# Altium footprint library ST Microelectronics STM32 G4.PcbLib: 21 footprints (part 2 of 3)
Each footprint in its own frame and in the unit in brackets; x right, y up, seen from the top. Pads: shape width x height; smd on the part's side, far side on the other; paste and mask are expansions set on the pad; w line width, h text height; cw(c..) or ccw(c..) is an arc to the next point about the centre after c.
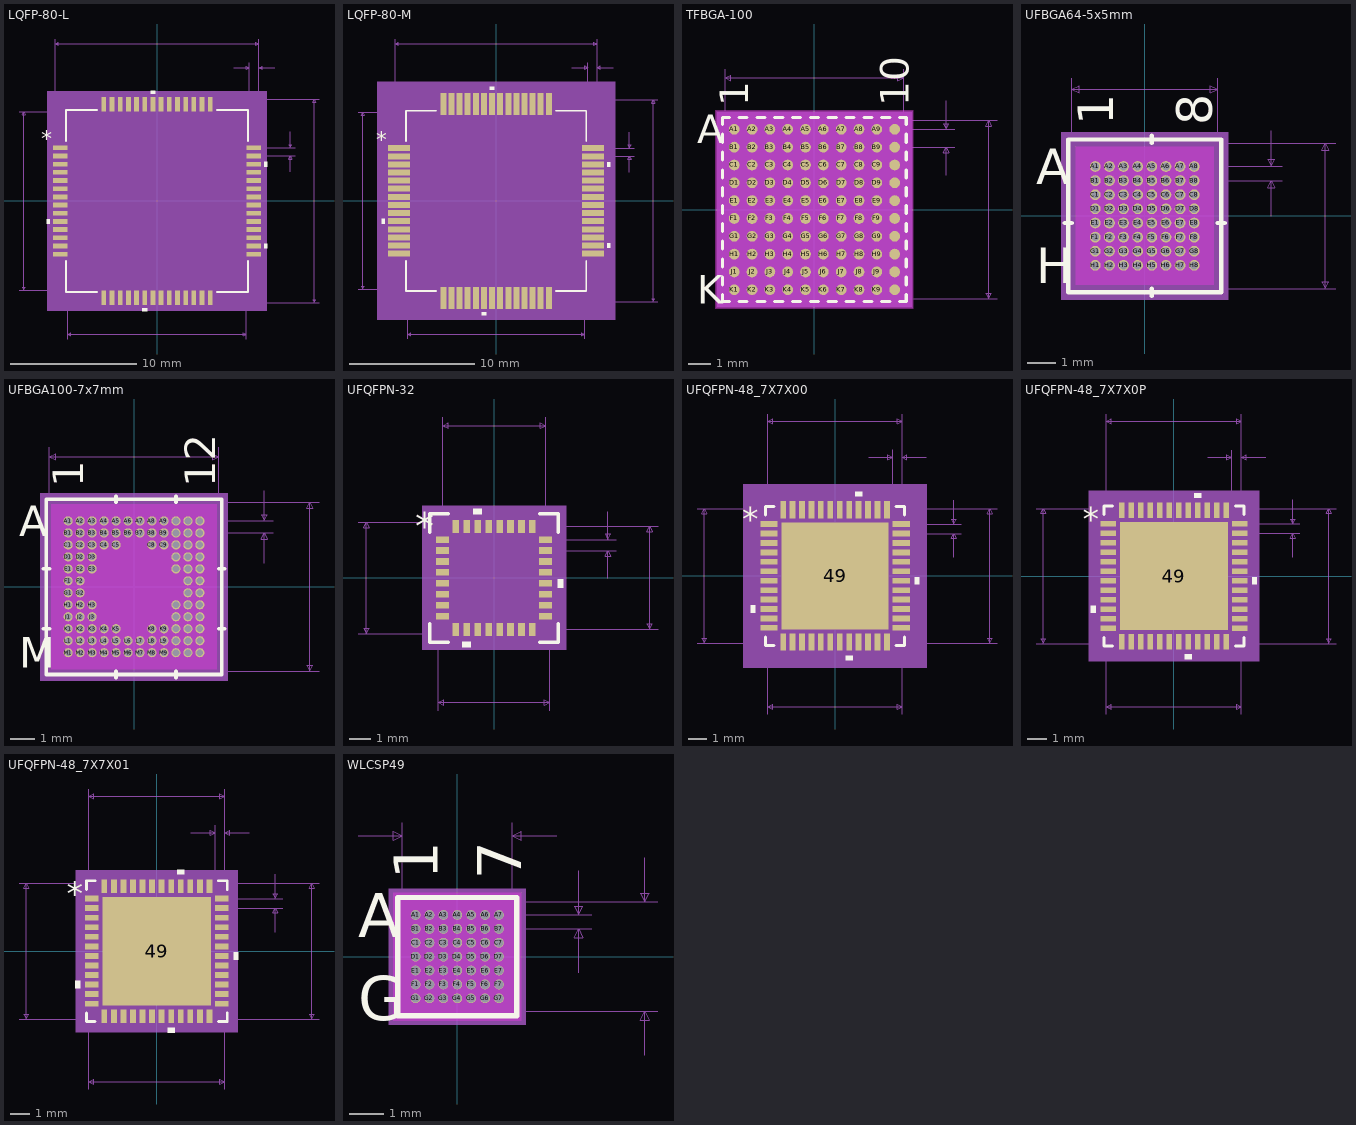
[diagram p1: the footprints below, top view; thin cyan lines are the x and y axes]

## LQFP-80-L [mil]
pads (56):
  rect 45.5x15 smd paste+0 mask+0: 1(-302.15,166.4) 2(-302.15,140.8) 3(-302.15,115.2) 4(-302.15,89.6) 5(-302.15,64) 6(-302.15,38.4) 7(-302.15,12.8) 8(-302.15,-12.8) 9(-302.15,-38.4) 10(-302.15,-64) 11(-302.15,-89.6) 12(-302.15,-115.2) 13(-302.15,-140.8) 14(-302.15,-166.4) 29(302.15,-166.4) 30(302.15,-140.8) 31(302.15,-115.2) 32(302.15,-89.6) 33(302.15,-64) 34(302.15,-38.4) 35(302.15,-12.8) 36(302.15,12.8) 37(302.15,38.4) 38(302.15,64) 39(302.15,89.6) 40(302.15,115.2) 41(302.15,140.8) 42(302.15,166.4)
  rect 15x45.5 smd paste+0 mask+0: 15(-166.4,-302.15) 16(-140.8,-302.15) 17(-115.2,-302.15) 18(-89.6,-302.15) 19(-64,-302.15) 20(-38.4,-302.15) 21(-12.8,-302.15) 22(12.8,-302.15) 23(38.4,-302.15) 24(64,-302.15) 25(89.6,-302.15) 26(115.2,-302.15) 27(140.8,-302.15) 28(166.4,-302.15) 43(166.4,302.15) 44(140.8,302.15) 45(115.2,302.15) 46(89.6,302.15) 47(64,302.15) 48(38.4,302.15) 49(12.8,302.15) 50(-12.8,302.15) 51(-38.4,302.15) 52(-64,302.15) 53(-89.6,302.15) 54(-115.2,302.15) 55(-140.8,302.15) 56(-166.4,302.15)
Top Overlay:
  region: -5.3,334.9 -20.3,334.9 -20.3,344.9 -5.3,344.9
  region: 334.9,122.7 344.9,122.7 344.9,107.7 334.9,107.7
  region: 334.9,-133.3 344.9,-133.3 344.9,-148.3 334.9,-148.3
  region: -30.9,-334.9 -45.9,-334.9 -45.9,-344.9 -30.9,-344.9
  region: -334.9,-56.5 -344.9,-56.5 -344.9,-71.5 -334.9,-71.5
  lines w6: -284.55,-187 -284.55,-284.55 -187,-284.55 ; -284.55,187 -284.55,284.55 -187,284.55 ; 187,-284.55 284.55,-284.55 284.55,-187 ; 187,284.55 284.55,284.55 284.55,187
  text "*" at -362.4,169.2 h50
Mechanical 5:
  region: 343.9,-343.9 -343.9,-343.9 -343.9,343.9 343.9,343.9
Mechanical 7:
  lines w1: -431.9,-279.55 -166.4,-279.55 ; -431.9,279.55 -166.4,279.55 ; -318.9,166.4 -318.9,506.9 ; -279.55,-431.9 -279.55,-166.4 ; 166.4,-318.9 506.9,-318.9 ; 166.4,318.9 506.9,318.9 ; 239.4,416.9 289.4,416.9 ; 279.55,-431.9 279.55,-166.4 ; 289.4,166.4 289.4,431.9 ; 302.15,140.8 431.9,140.8 ; 302.15,166.4 431.9,166.4 ; 318.9,431.9 318.9,166.4 318.9,506.9 ; 368.9,416.9 318.9,416.9 ; 416.9,90.8 416.9,140.8 ; 416.9,216.4 416.9,166.4 ; -416.9,-279.55 -411.9,-269.55 -421.9,-269.55 -416.9,-279.55 ; -416.9,-279.55 -416.9,279.55 ; -416.9,279.55 -411.9,269.55 -421.9,269.55 -416.9,279.55 ; -318.9,491.9 -308.9,486.9 -308.9,496.9 -318.9,491.9 ; -318.9,491.9 318.9,491.9 ; -279.55,-416.9 -269.55,-421.9 -269.55,-411.9 -279.55,-416.9 ; -279.55,-416.9 279.55,-416.9 ; 279.55,-416.9 269.55,-421.9 269.55,-411.9 279.55,-416.9 ; 289.4,416.9 279.4,411.9 279.4,421.9 289.4,416.9 ; 318.9,416.9 328.9,411.9 328.9,421.9 318.9,416.9 ; 318.9,491.9 308.9,486.9 308.9,496.9 318.9,491.9 ; 416.9,140.8 421.9,130.8 411.9,130.8 416.9,140.8 ; 416.9,166.4 421.9,176.4 411.9,176.4 416.9,166.4 ; 491.9,-318.9 496.9,-308.9 486.9,-308.9 491.9,-318.9 ; 491.9,-318.9 491.9,318.9 ; 491.9,318.9 496.9,308.9 486.9,308.9 491.9,318.9
  text "0.638in/16.2mm" at 511.9,-12.5 h25
  text "0.559in/14.201mm" at -636.9,-12.5 h25
  text "0.559in/14.201mm" at -100,-461.9 h25
  text "0.638in/16.2mm" at -87.5,511.9 h25
  text "0.03in/0.749mm" at 216.65,436.9 h25
  text "0.026in/0.65mm" at 436.9,141.1 h25
  text "Alt 2 Padstyle: OX90Y60D30P" at -337.5,-866.9 h50
  text "Alt 1 Padstyle: OX60Y90D30P" at -337.5,-806.9 h50
  text "Default Vert Padstyle: RX15Y45p5D0T" at -437.5,-626.9 h50
  text "Default Horiz Padstyle: RX15Y45p5D0T" at -450,-566.9 h50
Mechanical 13:
  drawing of 229 lines, arcs and shapes, not listed
  text "*" at -277.05,154.2 h50
Mechanical 15:
  region: -177.9,-283.55 -283.55,-283.55 -283.55,-177.9 -328.9,-177.9 -328.9,177.9 -283.55,177.9 -283.55,283.55 -177.9,283.55 -177.9,328.9 177.9,328.9 177.9,283.55 283.55,283.55 283.55,177.9 328.9,177.9 328.9,-177.9 283.55,-177.9 283.55,-283.55 177.9,-283.55 177.9,-328.9 -177.9,-328.9
  lines w6: -328.9,-177.9 -328.9,177.9 -283.55,177.9 -283.55,283.55 -177.9,283.55 -177.9,328.9 177.9,328.9 177.9,283.55 283.55,283.55 283.55,177.9 328.9,177.9 328.9,-177.9 283.55,-177.9 283.55,-283.55 177.9,-283.55 177.9,-328.9 -177.9,-328.9 -177.9,-283.55 -283.55,-283.55 -283.55,-177.9 -328.9,-177.9
3D body "LQFP-80-L.step": height 63.11, standoff 0, extent -318.89,-318.89 318.9,318.9

## LQFP-80-M [mil]
pads (56):
  rect 69.5x19 smd paste+0 mask+0: 1(-306.15,166.4) 2(-306.15,140.8) 3(-306.15,115.2) 4(-306.15,89.6) 5(-306.15,64) 6(-306.15,38.4) 7(-306.15,12.8) 8(-306.15,-12.8) 9(-306.15,-38.4) 10(-306.15,-64) 11(-306.15,-89.6) 12(-306.15,-115.2) 13(-306.15,-140.8) 14(-306.15,-166.4) 29(306.15,-166.4) 30(306.15,-140.8) 31(306.15,-115.2) 32(306.15,-89.6) 33(306.15,-64) 34(306.15,-38.4) 35(306.15,-12.8) 36(306.15,12.8) 37(306.15,38.4) 38(306.15,64) 39(306.15,89.6) 40(306.15,115.2) 41(306.15,140.8) 42(306.15,166.4)
  rect 19x69.5 smd paste+0 mask+0: 15(-166.4,-306.15) 16(-140.8,-306.15) 17(-115.2,-306.15) 18(-89.6,-306.15) 19(-64,-306.15) 20(-38.4,-306.15) 21(-12.8,-306.15) 22(12.8,-306.15) 23(38.4,-306.15) 24(64,-306.15) 25(89.6,-306.15) 26(115.2,-306.15) 27(140.8,-306.15) 28(166.4,-306.15) 43(166.4,306.15) 44(140.8,306.15) 45(115.2,306.15) 46(89.6,306.15) 47(64,306.15) 48(38.4,306.15) 49(12.8,306.15) 50(-12.8,306.15) 51(-38.4,306.15) 52(-64,306.15) 53(-89.6,306.15) 54(-115.2,306.15) 55(-140.8,306.15) 56(-166.4,306.15)
Top Overlay:
  region: -350.9,-56.5 -360.9,-56.5 -360.9,-71.5 -350.9,-71.5
  region: -30.9,-350.9 -45.9,-350.9 -45.9,-360.9 -30.9,-360.9
  region: 350.9,-133.3 360.9,-133.3 360.9,-148.3 350.9,-148.3
  region: 350.9,122.7 360.9,122.7 360.9,107.7 350.9,107.7
  region: -5.3,350.9 -20.3,350.9 -20.3,360.9 -5.3,360.9
  lines w6: -284.55,-189 -284.55,-284.55 -189,-284.55 ; -284.55,189 -284.55,284.55 -189,284.55 ; 189,-284.55 284.55,-284.55 284.55,-189 ; 189,284.55 284.55,284.55 284.55,189
  text "*" at -378.4,169.2 h50
Mechanical 5:
  region: 375.9,-375.9 -375.9,-375.9 -375.9,375.9 375.9,375.9
Mechanical 7:
  lines w1: -435.9,-279.55 -166.4,-279.55 ; -435.9,279.55 -166.4,279.55 ; -318.9,166.4 -318.9,510.9 ; -279.55,-435.9 -279.55,-166.4 ; 166.4,-318.9 510.9,-318.9 ; 166.4,318.9 510.9,318.9 ; 239.4,420.9 289.4,420.9 ; 279.55,-435.9 279.55,-166.4 ; 289.4,166.4 289.4,435.9 ; 306.15,140.8 435.9,140.8 ; 306.15,166.4 435.9,166.4 ; 318.9,435.9 318.9,166.4 318.9,510.9 ; 368.9,420.9 318.9,420.9 ; 420.9,90.8 420.9,140.8 ; 420.9,216.4 420.9,166.4 ; -420.9,-279.55 -420.9,279.55 ; -420.9,-279.55 -425.9,-269.55 -415.9,-269.55 -420.9,-279.55 ; -420.9,279.55 -425.9,269.55 -415.9,269.55 -420.9,279.55 ; -318.9,495.9 318.9,495.9 ; -318.9,495.9 -308.9,500.9 -308.9,490.9 -318.9,495.9 ; -279.55,-420.9 279.55,-420.9 ; -279.55,-420.9 -269.55,-415.9 -269.55,-425.9 -279.55,-420.9 ; 279.55,-420.9 269.55,-415.9 269.55,-425.9 279.55,-420.9 ; 289.4,420.9 279.4,425.9 279.4,415.9 289.4,420.9 ; 318.9,420.9 328.9,425.9 328.9,415.9 318.9,420.9 ; 318.9,495.9 308.9,500.9 308.9,490.9 318.9,495.9 ; 420.9,140.8 415.9,130.8 425.9,130.8 420.9,140.8 ; 420.9,166.4 415.9,176.4 425.9,176.4 420.9,166.4 ; 495.9,-318.9 495.9,318.9 ; 495.9,-318.9 490.9,-308.9 500.9,-308.9 495.9,-318.9 ; 495.9,318.9 490.9,308.9 500.9,308.9 495.9,318.9
  text "Default Horiz Padstyle: RX19Y69p5D0T" at -450,-570.9 h50
  text "Default Vert Padstyle: RX19Y69p5D0T" at -437.5,-630.9 h50
  text "Alt 1 Padstyle: OX60Y90D30P" at -337.5,-810.9 h50
  text "Alt 2 Padstyle: OX90Y60D30P" at -337.5,-870.9 h50
  text "0.026in/0.65mm" at 440.9,141.1 h25
  text "0.03in/0.749mm" at 216.65,440.9 h25
  text "0.638in/16.2mm" at -87.5,515.9 h25
  text "0.559in/14.201mm" at -100,-465.9 h25
  text "0.559in/14.201mm" at -640.9,-12.5 h25
  text "0.638in/16.2mm" at 515.9,-12.5 h25
Mechanical 13:
  drawing of 229 lines, arcs and shapes, not listed
  text "*" at -277.05,154.2 h50
Mechanical 15:
  region: -195.9,-299.55 -299.55,-299.55 -299.55,-195.9 -360.9,-195.9 -360.9,195.9 -299.55,195.9 -299.55,299.55 -195.9,299.55 -195.9,360.9 195.9,360.9 195.9,299.55 299.55,299.55 299.55,195.9 360.9,195.9 360.9,-195.9 299.55,-195.9 299.55,-299.55 195.9,-299.55 195.9,-360.9 -195.9,-360.9
  lines w6: -360.9,-195.9 -299.55,-195.9 -299.55,-299.55 -195.9,-299.55 -195.9,-360.9 195.9,-360.9 195.9,-299.55 299.55,-299.55 299.55,-195.9 360.9,-195.9 360.9,195.9 299.55,195.9 299.55,299.55 195.9,299.55 195.9,360.9 -195.9,360.9 -195.9,299.55 -299.55,299.55 -299.55,195.9 -360.9,195.9 -360.9,-195.9
3D body "LQFP-80-M.step": height 63.11, standoff 0, extent -318.89,-318.89 318.9,318.9

## TFBGA-100 [mil]
pads (100):
  round 19 smd paste+0 mask+0: A1(-141.73,141.73) A2(-110.24,141.73) A3(-78.74,141.73) A4(-47.24,141.73) A5(-15.75,141.73) A6(15.75,141.73) A7(47.24,141.73) A8(78.74,141.73) A9(110.24,141.73) A10(141.73,141.73) B1(-141.73,110.24) B2(-110.24,110.24) B3(-78.74,110.24) B4(-47.24,110.24) B5(-15.75,110.24) B6(15.75,110.24) B7(47.24,110.24) B8(78.74,110.24) B9(110.24,110.24) B10(141.73,110.24) C1(-141.73,78.74) C2(-110.24,78.74) C3(-78.74,78.74) C4(-47.24,78.74) C5(-15.75,78.74) C6(15.75,78.74) C7(47.24,78.74) C8(78.74,78.74) C9(110.24,78.74) C10(141.73,78.74) D1(-141.73,47.24) D2(-110.24,47.24) D3(-78.74,47.24) D4(-47.24,47.24) D5(-15.75,47.24) D6(15.75,47.24) D7(47.24,47.24) D8(78.74,47.24) D9(110.24,47.24) D10(141.73,47.24) E1(-141.73,15.75) E2(-110.24,15.75) E3(-78.74,15.75) E4(-47.24,15.75) E5(-15.75,15.75) E6(15.75,15.75) E7(47.24,15.75) E8(78.74,15.75) E9(110.24,15.75) E10(141.73,15.75) F1(-141.73,-15.75) F2(-110.24,-15.75) F3(-78.74,-15.75) F4(-47.24,-15.75) F5(-15.75,-15.75) F6(15.75,-15.75) F7(47.24,-15.75) F8(78.74,-15.75) F9(110.24,-15.75) F10(141.73,-15.75) G1(-141.73,-47.24) G2(-110.24,-47.24) G3(-78.74,-47.24) G4(-47.24,-47.24) G5(-15.75,-47.24) G6(15.75,-47.24) G7(47.24,-47.24) G8(78.74,-47.24) G9(110.24,-47.24) G10(141.73,-47.24) H1(-141.73,-78.74) H2(-110.24,-78.74) H3(-78.74,-78.74) H4(-47.24,-78.74) H5(-15.75,-78.74) H6(15.75,-78.74) H7(47.24,-78.74) H8(78.74,-78.74) H9(110.24,-78.74) H10(141.73,-78.74) J1(-141.73,-110.24) J2(-110.24,-110.24) J3(-78.74,-110.24) J4(-47.24,-110.24) J5(-15.75,-110.24) J6(15.75,-110.24) J7(47.24,-110.24) J8(78.74,-110.24) J9(110.24,-110.24) J10(141.73,-110.24) K1(-141.73,-141.73) K2(-110.24,-141.73) K3(-78.74,-141.73) K4(-47.24,-141.73) K5(-15.75,-141.73) K6(15.75,-141.73) K7(47.24,-141.73) K8(78.74,-141.73) K9(110.24,-141.73) K10(141.73,-141.73)
Top Overlay:
  lines w6: -162.5,-150.65 -162.5,-162.5 -150.65,-162.5 ; -162.5,-132.82 -162.5,-119.15 ; -162.5,-101.32 -162.5,-87.65 ; -162.5,-69.83 -162.5,-56.16 ; -162.5,-38.33 -162.5,-24.66 ; -162.5,-6.83 -162.5,6.83 ; -162.5,24.66 -162.5,38.33 ; -162.5,56.16 -162.5,69.83 ; -162.5,87.65 -162.5,101.32 ; -162.5,119.15 -162.5,132.82 ; -162.5,150.65 -162.5,162.5 -150.65,162.5 ; -132.82,-162.5 -119.15,-162.5 ; -132.82,162.5 -119.15,162.5 ; -101.32,-162.5 -87.65,-162.5 ; -101.32,162.5 -87.65,162.5 ; -69.83,-162.5 -56.16,-162.5 ; -69.83,162.5 -56.16,162.5 ; -38.33,-162.5 -24.66,-162.5 ; -38.33,162.5 -24.66,162.5 ; -6.83,-162.5 6.83,-162.5 ; -6.83,162.5 6.83,162.5 ; 24.66,-162.5 38.33,-162.5 ; 24.66,162.5 38.33,162.5 ; 56.16,-162.5 69.83,-162.5 ; 56.16,162.5 69.83,162.5 ; 87.65,-162.5 101.32,-162.5 ; 87.65,162.5 101.32,162.5 ; 119.15,-162.5 132.82,-162.5 ; 119.15,162.5 132.82,162.5 ; 150.65,-162.5 162.5,-162.5 162.5,-150.65 ; 150.65,162.5 162.5,162.5 162.5,150.65 ; 162.5,-132.82 162.5,-119.15 ; 162.5,-101.32 162.5,-87.65 ; 162.5,-69.83 162.5,-56.16 ; 162.5,-38.33 162.5,-24.66 ; 162.5,-6.83 162.5,6.83 ; 162.5,24.66 162.5,38.33 ; 162.5,56.16 162.5,69.83 ; 162.5,87.65 162.5,101.32 ; 162.5,119.15 162.5,132.82
  text "10" at 166.73,182.5 h50
  text "1" at -116.73,182.5 h50
  text "K" at -207.5,-166.73 h50
  text "A" at -207.5,116.73 h50
Bottom Overlay:
  text "10" at 116.73,182.5 h50
  text "1" at -166.73,182.5 h50
  text "K" at -182.5,-166.73 h50
  text "A" at -182.5,116.73 h50
Keep-Out Layer:
  region: -174.98,-174.98 -174.98,174.98 174.98,174.98 174.98,-174.98
Mechanical 5:
  region: 172.5,-172.5 -172.5,-172.5 -172.5,172.5 172.5,172.5
Mechanical 7:
  lines w1: -157.5,0 -157.5,247.5 ; 0,-157.5 322.5,-157.5 ; 0,157.5 322.5,157.5 ; 141.73,110.24 247.5,110.24 ; 141.73,141.73 247.5,141.73 ; 157.5,0 157.5,247.5 ; 232.5,60.24 232.5,110.24 ; 232.5,191.73 232.5,141.73 ; -157.5,232.5 -147.5,227.5 -147.5,237.5 -157.5,232.5 ; -157.5,232.5 157.5,232.5 ; 157.5,232.5 147.5,227.5 147.5,237.5 157.5,232.5 ; 232.5,110.24 237.5,100.24 227.5,100.24 232.5,110.24 ; 232.5,141.73 237.5,151.73 227.5,151.73 232.5,141.73 ; 307.5,-157.5 312.5,-147.5 302.5,-147.5 307.5,-157.5 ; 307.5,-157.5 307.5,157.5 ; 307.5,157.5 312.5,147.5 302.5,147.5 307.5,157.5
  text "0.315in/8.001mm" at 327.5,-12.5 h25
  text "0.315in/8.001mm" at -93.75,252.5 h25
  text "0.031in/0.8mm" at 252.5,113.48 h25
  text "Default Padstyle: EX19Y19D0TA" at -362.5,-357.5 h50
Mechanical 13:
  lines w1: -157.5,141.75 -141.75,157.5 ; -157.5,-157.5 -157.5,157.5 157.5,157.5 157.5,-157.5 -157.5,-157.5
  text "10" at 166.73,182.5 h50
  text "1" at -116.73,182.5 h50
  text "K" at -207.5,-166.73 h50
  text "A" at -207.5,116.73 h50
Mechanical 15:
  region: 167.5,-167.5 -167.5,-167.5 -167.5,167.5 167.5,167.5
  lines w6: -167.5,-167.5 167.5,-167.5 167.5,167.5 -167.5,167.5 -167.5,-167.5
3D body "TFBGA-100.step": height 43.11, standoff -0.01, extent -157.48,-157.48 157.49,157.49

## UFBGA64-5x5mm [mil]
pads (64):
  round 15 hole 11 mask+0: A1(-68.9,68.9) A2(-49.21,68.9) A3(-29.53,68.9) A4(-9.84,68.9) A5(9.84,68.9) A6(29.53,68.9) A7(49.21,68.9) A8(68.9,68.9) B1(-68.9,49.21) B2(-49.21,49.21) B3(-29.53,49.21) B4(-9.84,49.21) B5(9.84,49.21) B6(29.53,49.21) B7(49.21,49.21) B8(68.9,49.21) C1(-68.9,29.53) C2(-49.21,29.53) C3(-29.53,29.53) C4(-9.84,29.53) C5(9.84,29.53) C6(29.53,29.53) C7(49.21,29.53) C8(68.9,29.53) D1(-68.9,9.84) D2(-49.21,9.84) D3(-29.53,9.84) D4(-9.84,9.84) D5(9.84,9.84) D6(29.53,9.84) D7(49.21,9.84) D8(68.9,9.84) E1(-68.9,-9.84) E2(-49.21,-9.84) E3(-29.53,-9.84) E4(-9.84,-9.84) E5(9.84,-9.84) E6(29.53,-9.84) E7(49.21,-9.84) E8(68.9,-9.84) F1(-68.9,-29.53) F2(-49.21,-29.53) F3(-29.53,-29.53) F4(-9.84,-29.53) F5(9.84,-29.53) F6(29.53,-29.53) F7(49.21,-29.53) F8(68.9,-29.53) G1(-68.9,-49.21) G2(-49.21,-49.21) G3(-29.53,-49.21) G4(-9.84,-49.21) G5(9.84,-49.21) G6(29.53,-49.21) G7(49.21,-49.21) G8(68.9,-49.21) H1(-68.9,-68.9) H2(-49.21,-68.9) H3(-29.53,-68.9) H4(-9.84,-68.9) H5(9.84,-68.9) H6(29.53,-68.9) H7(49.21,-68.9) H8(68.9,-68.9)
Top Overlay:
  lines w6: -111.5,-9.84 -101.5,-9.84 ; 9.84,-111.5 9.84,-101.5 ; 9.84,101.5 9.84,111.5 ; 101.5,-9.84 111.5,-9.84 ; -106.5,-106.5 -106.5,106.5 106.5,106.5 106.5,-106.5 -106.5,-106.5
  text "8" at 93.9,126.5 h50
  text "1" at -43.9,126.5 h50
  text "H" at -151.5,-93.9 h50
  text "A" at -151.5,43.9 h50
Bottom Overlay:
  text "8" at 43.9,126.5 h50
  text "1" at -93.9,126.5 h50
  text "H" at -126.5,-93.9 h50
  text "A" at -126.5,43.9 h50
Keep-Out Layer:
  region: -96.24,-96.24 -96.24,96.24 96.24,96.24 96.24,-96.24
Mechanical 5:
  region: 116.5,-116.5 -116.5,-116.5 -116.5,116.5 116.5,116.5
Mechanical 7:
  lines w1: -101.5,0 -101.5,191.5 ; 0,-101.5 266.5,-101.5 ; 0,101.5 266.5,101.5 ; 68.9,49.21 191.5,49.21 ; 68.9,68.9 191.5,68.9 ; 101.5,0 101.5,191.5 ; 176.5,-0.79 176.5,49.21 ; 176.5,118.9 176.5,68.9 ; -101.5,176.5 -91.5,171.5 -91.5,181.5 -101.5,176.5 ; -101.5,176.5 101.5,176.5 ; 101.5,176.5 91.5,171.5 91.5,181.5 101.5,176.5 ; 176.5,49.21 181.5,39.21 171.5,39.21 176.5,49.21 ; 176.5,68.9 181.5,78.9 171.5,78.9 176.5,68.9 ; 251.5,-101.5 256.5,-91.5 246.5,-91.5 251.5,-101.5 ; 251.5,-101.5 251.5,101.5 ; 251.5,101.5 256.5,91.5 246.5,91.5 251.5,101.5
  text "0.203in/5.156mm" at 271.5,-12.5 h25
  text "0.203in/5.156mm" at -93.75,196.5 h25
  text "0.02in/0.5mm" at 196.5,46.56 h25
  text "Default Padstyle: EX15Y15D11P" at -362.5,-301.5 h50
Mechanical 13:
  lines w1: -101.5,91.66 -91.66,101.5 ; -101.5,-101.5 -101.5,101.5 101.5,101.5 101.5,-101.5 -101.5,-101.5
  text "8" at 93.9,126.5 h50
  text "1" at -43.9,126.5 h50
  text "H" at -151.5,-93.9 h50
  text "A" at -151.5,43.9 h50
Mechanical 15:
  region: 111.5,-111.5 -111.5,-111.5 -111.5,111.5 111.5,111.5
  lines w6: -111.5,-111.5 111.5,-111.5 111.5,111.5 -111.5,111.5 -111.5,-111.5
3D body "UFBGA64-5x5mm.step": height 24.09, standoff -0.02, extent -101.49,-101.49 101.51,101.51

## UFBGA100-7x7mm [mil]
pads (100):
  round 15 hole 11 mask+0: A1(-108.27,108.27) A2(-88.58,108.27) A3(-68.9,108.27) A4(-49.21,108.27) A5(-29.53,108.27) A6(-9.84,108.27) A7(9.84,108.27) A8(29.53,108.27) A9(49.21,108.27) A10(68.9,108.27) A11(88.58,108.27) A12(108.27,108.27) B1(-108.27,88.58) B2(-88.58,88.58) B3(-68.9,88.58) B4(-49.21,88.58) B5(-29.53,88.58) B6(-9.84,88.58) B7(9.84,88.58) B8(29.53,88.58) B9(49.21,88.58) B10(68.9,88.58) B11(88.58,88.58) B12(108.27,88.58) C1(-108.27,68.9) C2(-88.58,68.9) C3(-68.9,68.9) C4(-49.21,68.9) C5(-29.53,68.9) C8(29.53,68.9) C9(49.21,68.9) C10(68.9,68.9) C11(88.58,68.9) C12(108.27,68.9) D1(-108.27,49.21) D2(-88.58,49.21) D3(-68.9,49.21) D10(68.9,49.21) D11(88.58,49.21) D12(108.27,49.21) E1(-108.27,29.53) E2(-88.58,29.53) E3(-68.9,29.53) E10(68.9,29.53) E11(88.58,29.53) E12(108.27,29.53) F1(-108.27,9.84) F2(-88.58,9.84) F11(88.58,9.84) F12(108.27,9.84) G1(-108.27,-9.84) G2(-88.58,-9.84) G11(88.58,-9.84) G12(108.27,-9.84) H1(-108.27,-29.53) H2(-88.58,-29.53) H3(-68.9,-29.53) H10(68.9,-29.53) H11(88.58,-29.53) H12(108.27,-29.53) J1(-108.27,-49.21) J2(-88.58,-49.21) J3(-68.9,-49.21) J10(68.9,-49.21) J11(88.58,-49.21) J12(108.27,-49.21) K1(-108.27,-68.9) K2(-88.58,-68.9) K3(-68.9,-68.9) K4(-49.21,-68.9) K5(-29.53,-68.9) K8(29.53,-68.9) K9(49.21,-68.9) K10(68.9,-68.9) K11(88.58,-68.9) K12(108.27,-68.9) L1(-108.27,-88.58) L2(-88.58,-88.58) L3(-68.9,-88.58) L4(-49.21,-88.58) L5(-29.53,-88.58) L6(-9.84,-88.58) L7(9.84,-88.58) L8(29.53,-88.58) L9(49.21,-88.58) L10(68.9,-88.58) L11(88.58,-88.58) L12(108.27,-88.58) M1(-108.27,-108.27) M2(-88.58,-108.27) M3(-68.9,-108.27) M4(-49.21,-108.27) M5(-29.53,-108.27) M6(-9.84,-108.27) M7(9.84,-108.27) M8(29.53,-108.27) M9(49.21,-108.27) M10(68.9,-108.27) M11(88.58,-108.27) M12(108.27,-108.27)
Top Overlay:
  lines w6: -149,-68.9 -139,-68.9 ; -149,29.53 -139,29.53 ; -29.53,-149 -29.53,-139 ; -29.53,139 -29.53,149 ; 68.9,-149 68.9,-139 ; 68.9,139 68.9,149 ; 139,-68.9 149,-68.9 ; 139,29.53 149,29.53 ; -144,-144 144,-144 144,144 -144,144 -144,-144
  text "A" at -189,83.27 h50
  text "M" at -189,-133.27 h50
  text "1" at -83.27,164 h50
  text "12" at 133.27,164 h50
Bottom Overlay:
  text "A" at -164,83.27 h50
  text "M" at -164,-133.27 h50
  text "1" at -133.27,164 h50
  text "12" at 83.27,164 h50
Keep-Out Layer:
  region: -135.61,-135.61 -135.61,135.61 135.61,135.61 135.61,-135.61
Mechanical 5:
  region: 154,-154 -154,-154 -154,154 154,154
Mechanical 7:
  lines w1: -139,0 -139,229 ; 0,-139 304,-139 ; 0,139 304,139 ; 108.27,88.58 229,88.58 ; 108.27,108.27 229,108.27 ; 139,0 139,229 ; 214,38.58 214,88.58 ; 214,158.27 214,108.27 ; -139,214 139,214 ; -139,214 -129,219 -129,209 -139,214 ; 139,214 129,219 129,209 139,214 ; 214,88.58 209,78.58 219,78.58 214,88.58 ; 214,108.27 209,118.27 219,118.27 214,108.27 ; 289,-139 289,139 ; 289,-139 284,-129 294,-129 289,-139 ; 289,139 284,129 294,129 289,139
  text "Default Padstyle: EX15Y15D11P" at -362.5,-339 h50
  text "0.02in/0.5mm" at 234,85.93 h25
  text "0.278in/7.061mm" at -93.75,234 h25
  text "0.278in/7.061mm" at 309,-12.5 h25
Mechanical 13:
  lines w1: -139,129.16 -129.16,139 ; -139,-139 139,-139 139,139 -139,139 -139,-139
  text "A" at -189,83.27 h50
  text "M" at -189,-133.27 h50
  text "1" at -83.27,164 h50
  text "12" at 133.27,164 h50
Mechanical 15:
  region: 149,-149 -149,-149 -149,149 149,149
  lines w6: -149,-149 -149,149 149,149 149,-149 -149,-149
3D body "UFBGA100-7x7mm.step": height 24.09, standoff -0.02, extent -139.01,-139.01 139.02,139.02
